# Altium footprint library SMT.PcbLib: 325 footprints (part 20 of 21)
Each footprint in its own frame and in the unit in brackets; x right, y up, seen from the top. Pads: shape width x height; smd on the part's side, far side on the other; paste and mask are expansions set on the pad; w line width, h text height; cw(c..) or ccw(c..) is an arc to the next point about the centre after c.
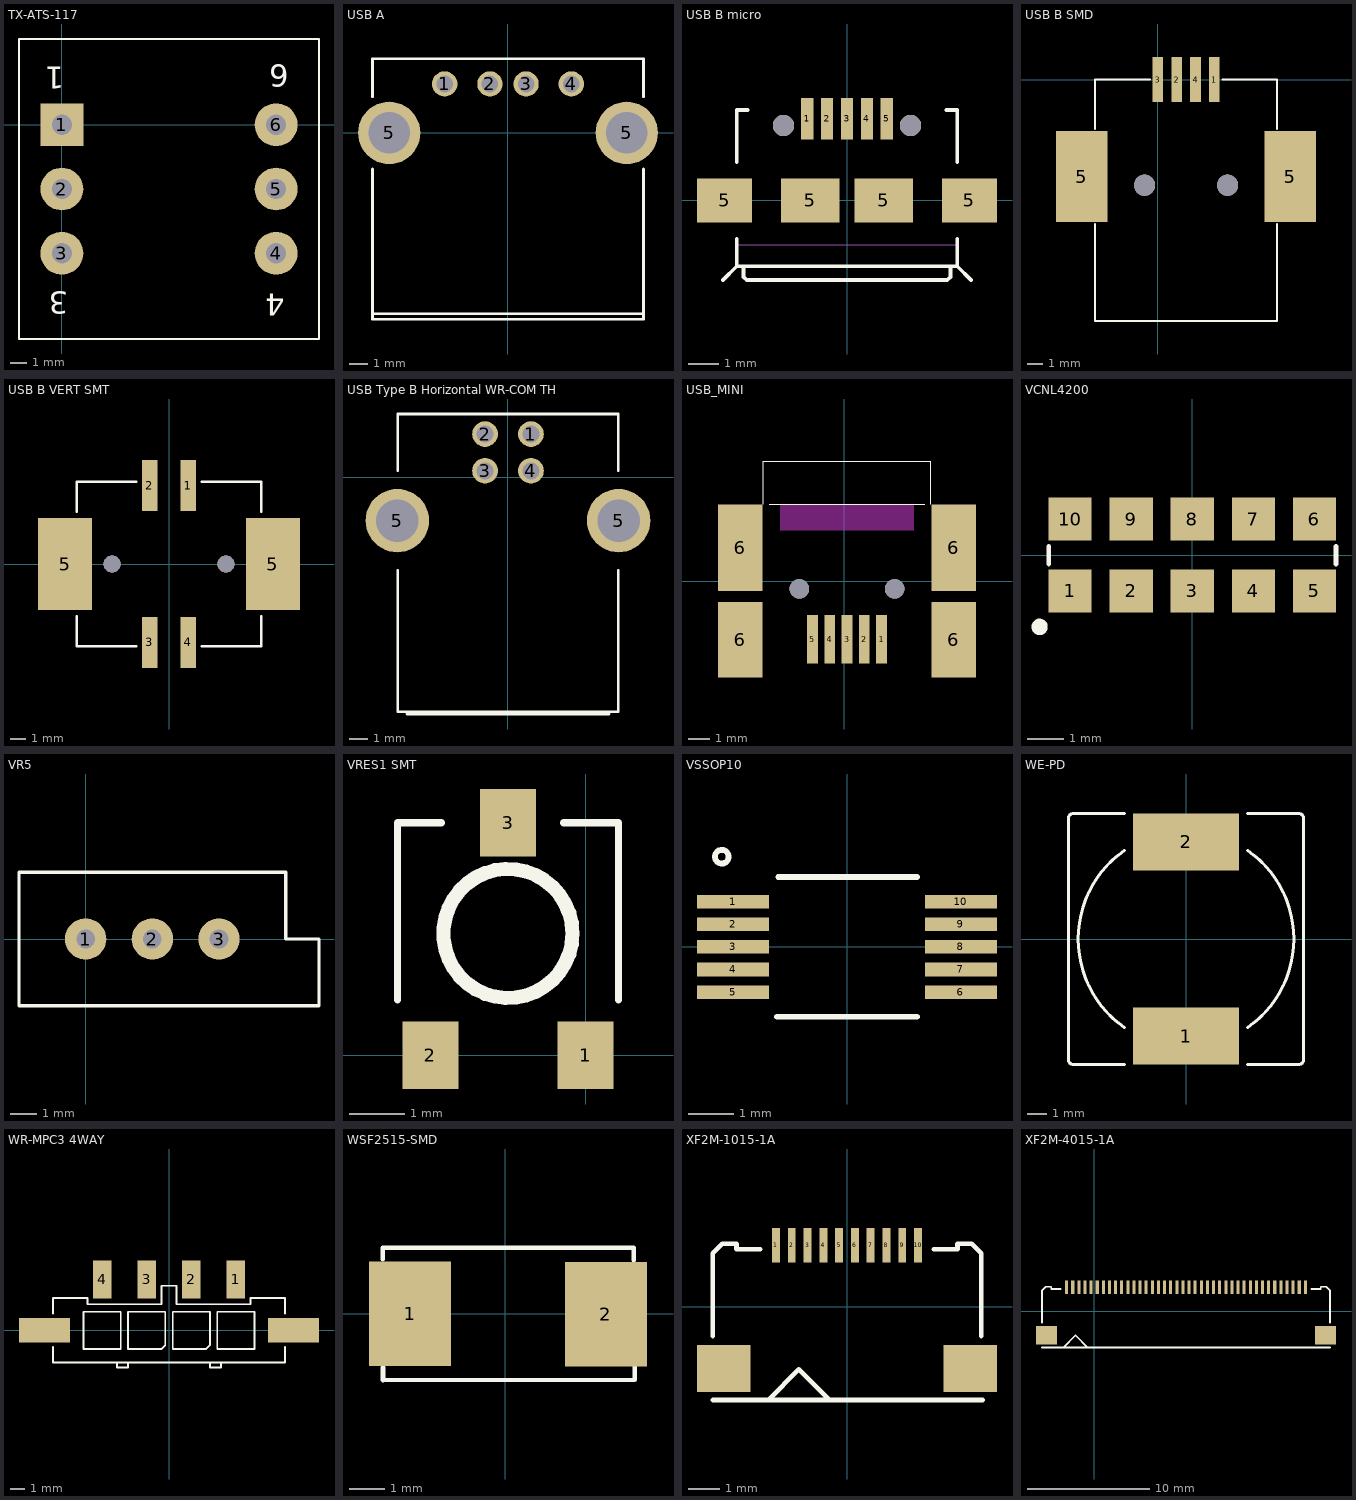
[diagram p19: the footprints below, top view; thin cyan lines are the x and y axes]

## TX-ATS-117 [mil]
pads (6):
  rect 100x100 hole 47: 1(0,0)
  round 100 hole 47: 2(0,-150) 3(0,-300) 4(500,-300) 5(500,-150) 6(500,0)
TopOverlay:
  lines w5: -100,-500 600,-500 600,200 -100,200 -100,-500
  text "3" at 15,-390 h52
  text "1" at 5,135 h52
  text "6" at 530,140 h52
  text "4" at 520,-395 h52

## USB A [mm] "USB SOCKET TYPE A, R/A"
height 0.171
pads (6):
  round 1.4 hole 0.92: 1(-3.5,2.71) 2(-1,2.71) 3(1,2.71) 4(3.5,2.71)
  round 3.45 hole 2.3: 5(-6.57,0) 5(6.57,0)
TopOverlay:
  lines w0.152: -7.5,-10 7.5,-10 ; -7.5,-2 -7.5,-10.3 0,-10.3 7.5,-10.3 7.5,-2 ; -7.5,2 -7.5,4.1 0,4.1 7.5,4.1 7.5,2
3D body "STEP-61400416021-rev1.stp": height 7.63, standoff -4.06, extent -8.023,-10.35 7.973,3.65

## USB B micro [mm] "Wurth 629105136821 (P/N 2442736)"
height 2.5
pads (11):
  rect 0.4x1.35 smd: 1(-1.3,2.675) 2(-0.65,2.675) 3(0,2.675) 4(0.65,2.675) 5(1.3,2.675)
  rect 1.8x1.45 smd: 5(-4,0) 5(4,0)
  rect 1.9x1.45 smd: 5(-1.2,0) 5(1.2,0)
  round 0.7 hole 0.7 unplated: ""(-2.075,2.45) ""(2.075,2.45)
TopOverlay:
  lines w0.127: -4.05,-2.6 -3.6,-2.15 ; -3.6,-1.25 -3.6,-2.15 ; -3.6,1.25 -3.6,2.95 -3.25,2.95 ; -3.375,-2.15 -3.375,-2.5 -3.275,-2.6 3.275,-2.6 3.375,-2.5 3.375,-2.15 ; 3.25,2.95 3.6,2.95 3.6,1.25 ; 3.6,-1.25 3.6,-2.15 ; 4.05,-2.6 3.6,-2.15 ; -3.6,-2.15 0,-2.15 3.6,-2.15
Mechanical1:
  lines w0.025: -3.6,-1.45 0,-1.45 3.6,-1.45
3D body "STEP-629105136821-rev1.stp": height 2.69, standoff -0.61, extent -4,-2.753 4,3.15

## USB B SMD [mm]
pads (8):
  rect 0.7x3 smd: 1(3.75,0) 2(1.25,0) 3(0,0) 4(2.5,0)
  rect 3.4x6.04 smd: 5(-5.045,-6.43) 5(8.785,-6.43)
  round 1.4 hole 1.4 unplated: ""(-0.875,-7) ""(4.625,-7)
TopOverlay:
  lines w0.127: -4.145,-9.58 -4.145,-16 7.895,-16 7.895,-9.58 ; -4.145,-3.27 -4.145,0 -0.525,0 ; 4.275,0 7.895,0 7.895,-3.27

## USB B VERT SMT [mm] "WURTH 629104142721"
height 0.381
pads (8):
  rect 1x3.3 smd: 1(1.25,5.1) 2(-1.25,5.1) 3(-1.25,-5.1) 4(1.25,-5.1)
  rect 3.5x6 smd: 5(-6.75,0) 5(6.75,0)
  round 1.1 hole 1.1 unplated: ""(-3.7,0) ""(3.7,0)
TopOverlay:
  lines w0.152: -6,-3.375 -6,-5.35 -2.125,-5.35 ; -6,3.375 -6,5.35 -2.125,5.35 ; 2.125,-5.35 6,-5.35 6,-3.375 ; 2.125,5.35 6,5.35 6,3.375

## USB Type B Horizontal WR-COM TH [mm] "Wurth - 61400416121"
height 10.9
pads (6):
  round 1.4 hole 0.92: 1(1.25,2.355) 2(-1.25,2.355) 3(-1.25,0.355) 4(1.25,0.355)
  round 3.45 hole 2.3: 5(-6.02,-2.355) 5(6.02,-2.355)
TopOverlay:
  lines w0.152: -6,-5.065 -6,-12.755 6,-12.755 6,-5.065 ; -6,0.355 -6,3.445 6,3.445 6,0.355 ; -5.5,-12.875 5.5,-12.875

## USB_MINI [mm]
pads (12):
  rect 0.5x2.25 smd: 1(1.727,-2.673) 2(0.927,-2.673) 3(0.127,-2.673) 4(-0.673,-2.673) 5(-1.473,-2.673)
  rect 2.05x3.5 smd: 6(-4.798,-2.698) 6(5.052,-2.698)
  rect 2.05x4 smd: 6(-4.798,1.552) 6(5.052,1.552)
  round 0.9 hole 0.9 unplated: ""(-2.073,-0.348) ""(2.327,-0.348)
  rect 6.2x1.2 on Keep-Out: ""(0.127,2.952)
TopOverlay:
  lines w0.025: -3.748,3.552 -3.748,5.552 4.002,5.552 4.002,3.552 ; -3.473,3.552 0.127,3.552 3.727,3.552
3D body: height 3.1, standoff 0, extent -3.75,-3.751 4.002,5.552

## VCNL4200 [mm] "Optical Sensor Ambient 550nm I²C 10-SMD Module"
height 1.8
pads (10):
  rect 1.2x1.2 smd: 1(-3.4,-1) 2(-1.7,-1) 3(0,-1) 4(1.7,-1) 5(3.4,-1) 6(3.4,1) 7(1.7,1) 8(0,1) 9(-1.7,1) 10(-3.4,1)
TopOverlay:
  circle w0.254: c-4.25,-2 r0.1
  lines w0.127: -4,-0.25 -4,0 -4,0.25 ; 4,-0.25 4,0 4,0.25
3D body "84588VCNL4200.stp": height 1.8, standoff 0, extent -4,-1.5 4,1.5

## VR5 [mil]
pads (3):
  round 62 hole 28: 1(0,0) 2(100,0) 3(200,0)
TopOverlay:
  lines w5: -100,-100 350,-100 350,0 300,0 300,100 -100,100 -100,-100

## VRES1 SMT [mil]
pads (3):
  rect 40x48 smd: 1(0,0) 2(-110.24,0) 3(-55.12,165.35)
TopOverlay:
  circle w10: c-55.12,86.61 r45.91
  lines w5: -133.86,39.37 -133.86,165.35 -102.36,165.35 ; -15.75,165.35 23.62,165.35 23.62,39.37

## VSSOP10 [mm] "PLASTIC SMALL-OUTLINE PACKAGE"
height 1.1
pads (10):
  rect 1.6x0.3 smd: 1(-2.525,1) 2(-2.525,0.5) 3(-2.525,0) 4(-2.525,-0.5) 5(-2.525,-1) 6(2.525,-1) 7(2.525,-0.5) 8(2.525,0) 9(2.525,0.5) 10(2.525,1)
TopOverlay:
  circle w0.127: c-2.775,2 r0.152
  lines w0.127: -1.55,-1.55 0,-1.55 1.55,-1.55 ; -1.525,1.55 0,1.55 1.55,1.55
3D body: height 1.1, standoff 0, extent -1.55,-1.55 1.55,1.549

## WE-PD [mm] "WE-PD SMD SHIELDED POWER INDUCTOR"
height 0.254
pads (2):
  rect 5.4x2.9 smd: 1(0,-4.95) 2(0,4.95)
TopOverlay:
  lines w0.152: -3.125,-6.4 -5.75,-6.4 cw(c-5.75,-6.15) -6,-6.15 -6,0 -6,6.15 cw(c-5.75,6.15) -5.75,6.4 -3.125,6.4 ; -3.125,-4.526 cw(c0,0) -3.125,4.526 ; 3.125,-6.4 5.75,-6.4 ccw(c5.75,-6.15) 6,-6.15 6,0 6,6.15 ccw(c5.75,6.15) 5.75,6.4 3.125,6.4 ; 3.125,-4.526 ccw(c0,0) 3.125,4.526

## WR-MPC3 4WAY [mm] "MALE HEADER WR-MPC3"
height 9.9
pads (6):
  rect 1.27x2.54 smd: 1(4.5,3.42) 2(1.5,3.42) 3(-1.5,3.42) 4(-4.5,3.42)
  rect 3.43x1.65 smd: ""(-8.39,0) ""(8.39,0)
TopOverlay:
  lines w0.127: -7.825,-1.125 -7.825,-2.185 0,-2.185 7.825,-2.185 7.825,-1.125 ; -7.825,1.125 -7.825,2.185 -5.5,2.185 -5.5,1.75 -0.5,1.75 -0.5,2.25 -0.5,3 0.5,3 0.5,1.75 5.5,1.75 5.5,2.185 7.825,2.185 7.825,1.125 ; -3.5,-2.185 -3.5,-2.5 -2.75,-2.5 -2.75,-2.185 ; 2.75,-2.185 2.75,-2.5 3.5,-2.5 3.5,-2.185 ; -0.25,-1 -0.25,1.25 -2.75,1.25 -2.75,-1.25 -0.5,-1.25 -0.25,-1 ; -0.25,-1 -0.25,-1 ; 2.75,-1 2.5,-1.25 0.25,-1.25 0.25,1.25 2.75,1.25 2.75,-1 ; 2.75,-1 2.75,-1 ; -5.75,-1.25 -5.75,1.25 -3.25,1.25 -3.25,-1.25 -5.75,-1.25 ; 3.25,-1.25 5.75,-1.25 5.75,1.25 3.25,1.25 3.25,-1.25
3D body: height 6.6, standoff 3.3, extent 4.125,-0.375 4.875,0.375
3D body: height 6.6, standoff 3.3, extent 1.125,-0.375 1.875,0.375
3D body: height 6.6, standoff 3.3, extent -1.875,-0.375 -1.125,0.375
3D body: height 6.6, standoff 3.3, extent -4.875,-0.375 -4.125,0.375
3D body: height 9.9, standoff 3.3, extent -7.825,-2.175 7.825,2.175
3D body: height 3.3, standoff 0, extent -7.825,-2.175 7.825,2.175

## WSF2515-SMD [mm]
pads (2):
  rect 2.29x2.92 smd: 1(-2.662,0) 2(2.83,-0.013)
TopOverlay:
  lines w0.127: -3.434,1.532 -3.434,1.849 3.614,1.849 3.614,1.506 ; -3.421,-1.504 -3.421,-1.862 3.642,-1.847 3.642,-1.46

## XF2M-1015-1A [mm] "0.5mm Pitch, Dual Contact"
height 3.2
pads (12):
  rect 0.25x1.1 smd: 1(-2.25,1.95) 2(-1.75,1.95) 3(-1.25,1.95) 4(-0.75,1.95) 5(-0.25,1.95) 6(0.25,1.95) 7(0.75,1.95) 8(1.25,1.95) 9(1.75,1.95) 10(2.25,1.95)
  rect 1.7x1.5 smd: ""(-3.9,-1.95) ""(3.9,-1.95)
TopOverlay:
  lines w0.152: -4.25,-2.95 4.3,-2.95 ; -4.25,-0.925 -4.25,1.7 -3.95,2 -3.5,2 -3.5,1.825 -2.75,1.825 ; -2.5,-2.95 -1.525,-1.975 -0.55,-2.95 ; 2.75,1.825 3.5,1.825 3.5,2 3.95,2 4.25,1.7 4.25,-0.925

## XF2M-4015-1A [mm] "0.5mm Pitch, Dual Contact"
height 3.2
pads (42):
  rect 0.25x1.1 smd: 1(-2.25,1.95) 2(-1.75,1.95) 3(-1.25,1.95) 4(-0.75,1.95) 5(-0.25,1.95) 6(0.25,1.95) 7(0.75,1.95) 8(1.25,1.95) 9(1.75,1.95) 10(2.25,1.95) 11(2.75,1.95) 12(3.25,1.95) 13(3.75,1.95) 14(4.25,1.95) 15(4.75,1.95) 16(5.25,1.95) 17(5.75,1.95) 18(6.25,1.95) 19(6.75,1.95) 20(7.25,1.95) 21(7.75,1.95) 22(8.25,1.95) 23(8.75,1.95) 24(9.25,1.95) 25(9.75,1.95) 26(10.25,1.95) 27(10.75,1.95) 28(11.25,1.95) 29(11.75,1.95) 30(12.25,1.95) 31(12.75,1.95) 32(13.25,1.95) 33(13.75,1.95) 34(14.25,1.95) 35(14.75,1.95) 36(15.25,1.95) 37(15.75,1.95) 38(16.25,1.95) 39(16.75,1.95) 40(17.25,1.95)
  rect 1.7x1.5 smd: ""(-3.9,-1.95) ""(18.9,-1.95)
TopOverlay:
  lines w0.152: -4.25,-2.95 19.25,-2.95 ; -4.25,-0.925 -4.25,1.7 -3.95,2 -3.5,2 -3.5,1.825 -2.75,1.825 ; -2.5,-2.95 -1.525,-1.975 -0.55,-2.95 ; 17.75,1.825 18.5,1.825 18.5,2 18.95,2 19.25,1.7 19.25,-0.925